# Altium footprint library connecteurs.PcbLib: 162 footprints (part 8 of 11)
Each footprint in its own frame and in the unit in brackets; x right, y up, seen from the top. Pads: shape width x height; smd on the part's side, far side on the other; paste and mask are expansions set on the pad; w line width, h text height; cw(c..) or ccw(c..) is an arc to the next point about the centre after c.
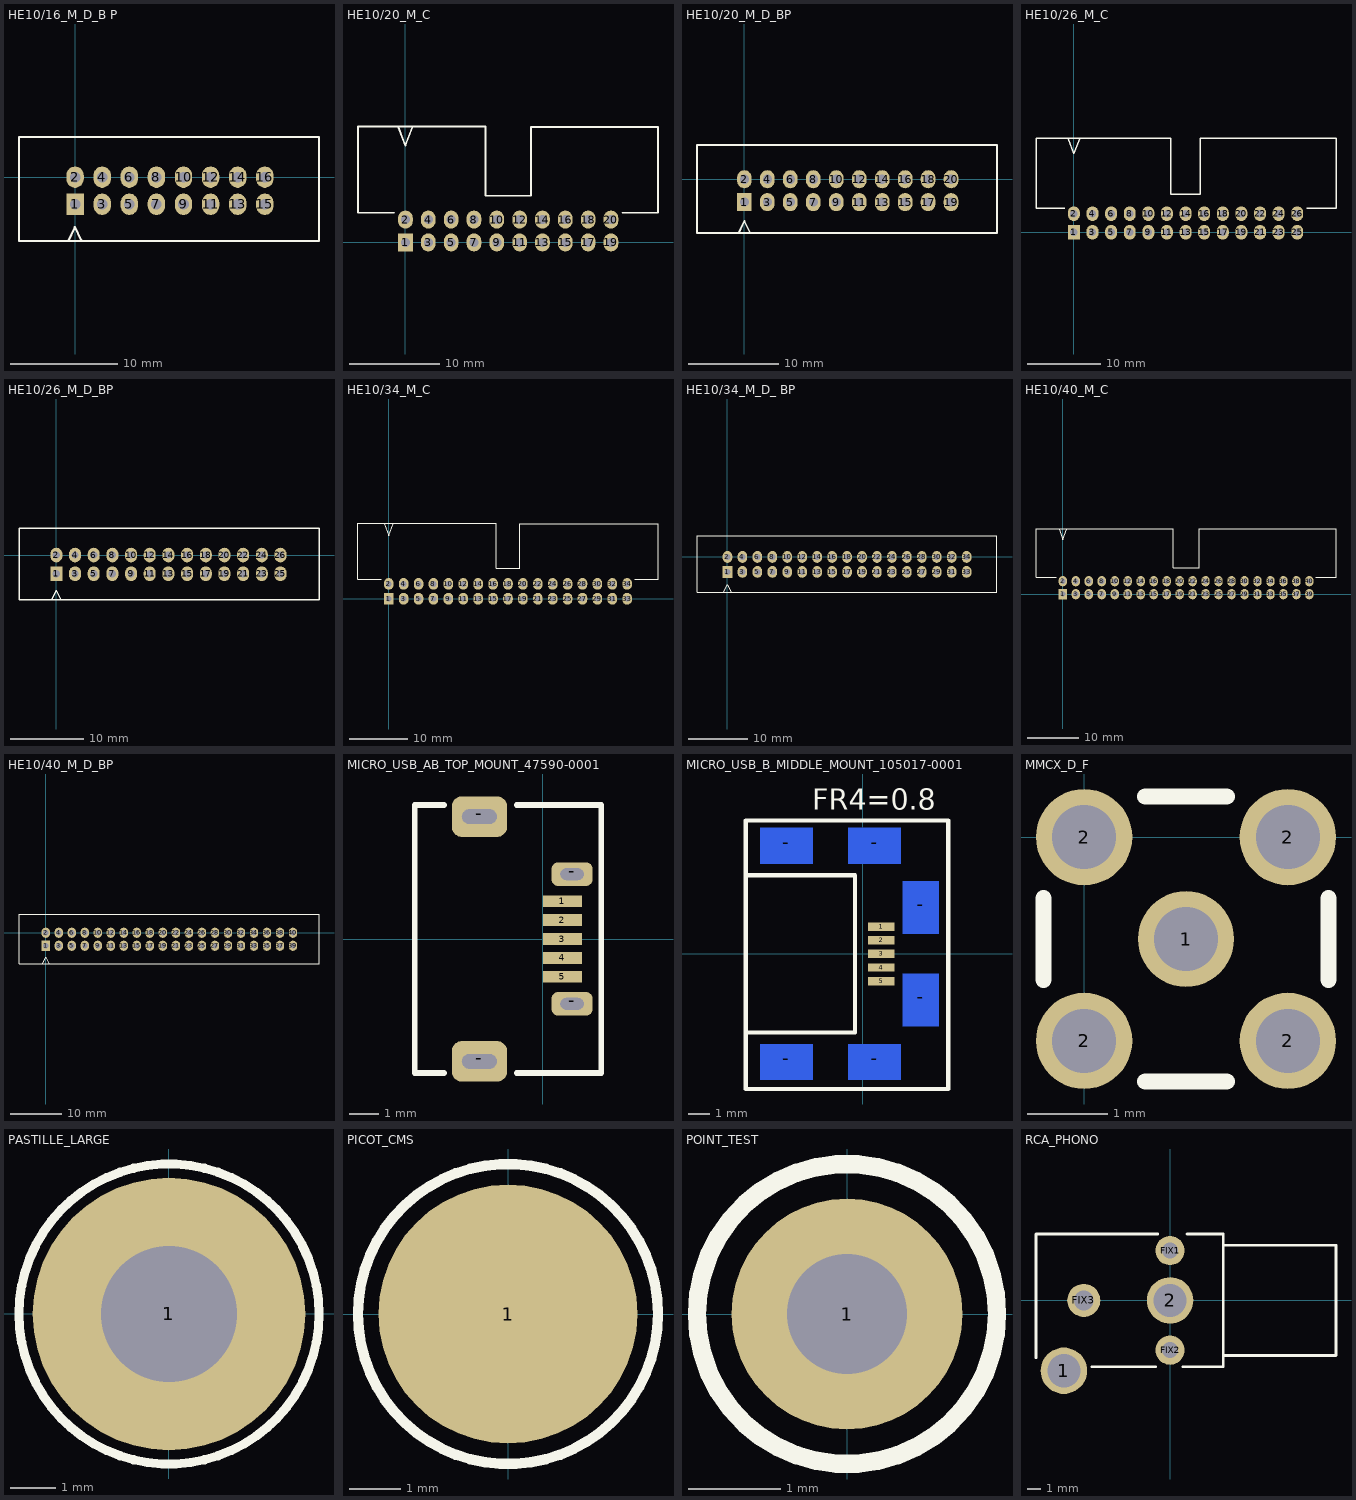
[diagram p7: the footprints below, top view; thin cyan lines are the x and y axes]

## HE10/16_M_D_B P [mm] "HE10 ; 16 CONTACTS ; MALE ;  DROIT; BAS PROFIL ; ESPACEMENTS BROCHES = 2.54 mm"
height 9
pads (16):
  rect 1.63x2 hole 1: 1(0,-2.54)
  oval 1.63x2 hole 1: 2(0,0) 3(2.54,-2.54) 4(2.54,0) 5(5.08,-2.54) 6(5.08,0) 7(7.62,-2.54) 8(7.62,0) 9(10.16,-2.54) 10(10.16,0) 11(12.7,-2.54) 12(12.7,0) 13(15.24,-2.54) 14(15.24,0) 15(17.78,-2.54) 16(17.78,0)
Top Overlay:
  lines w0.2: -0.627,-5.952 -0.03,-4.684 0.57,-5.9 ; -5.26,-6 -5.26,3.78 22.86,3.78 22.86,-6 -5.26,-6
3D body: height 8.8, standoff -3, extent -5.1,-5.8 22.72,3.6

## HE10/20_M_C [mm] "HE10 ; 20 CONTACTS ; MALE ;  COUDE; ESPACEMENTS BROCHES = 2.54 mm"
height 9
pads (20):
  rect 1.63x2 hole 1: 1(0,0)
  oval 1.63x2 hole 1: 2(0,2.54) 3(2.54,0) 4(2.54,2.54) 5(5.08,0) 6(5.08,2.54) 7(7.62,0) 8(7.62,2.54) 9(10.16,0) 10(10.16,2.54) 11(12.7,0) 12(12.7,2.54) 13(15.24,0) 14(15.24,2.54) 15(17.78,0) 16(17.78,2.54) 17(20.32,0) 18(20.32,2.54) 19(22.86,0) 20(22.86,2.54)
Top Overlay:
  lines w0.2: -1.27,3.29 -5.28,3.29 -5.28,12.88 8.89,12.88 8.89,5.18 13.97,5.18 13.97,12.84 28.09,12.84 28.09,3.29 24.13,3.29 ; -0.772,12.8 -0.01,10.768 0.752,12.8
3D body: height 9.56, standoff -3.14, extent -5.13,-0.354 27.89,12.6

## HE10/20_M_D_BP [mm] "HE10 ; 20 CONTACTS ; MALE ; DROIT; BAS PROFIL ; ESPACEMENTS BROCHES = 2.54 mm"
height 9
pads (20):
  rect 1.63x2 hole 1: 1(0,-2.54)
  oval 1.63x2 hole 1: 2(0,0) 3(2.54,-2.54) 4(2.54,0) 5(5.08,-2.54) 6(5.08,0) 7(7.62,-2.54) 8(7.62,0) 9(10.16,-2.54) 10(10.16,0) 11(12.7,-2.54) 12(12.7,0) 13(15.24,-2.54) 14(15.24,0) 15(17.78,-2.54) 16(17.78,0) 17(20.32,-2.54) 18(20.32,0) 19(22.86,-2.54) 20(22.86,0)
Top Overlay:
  lines w0.2: -0.6,-5.88 -0.004,-4.614 0,-4.614 0.6,-5.83 ; -5.24,-5.93 -5.24,3.77 27.94,3.77 27.94,-5.93 -5.24,-5.93
3D body: height 8.8, standoff -3, extent -5.1,-5.8 27.8,3.6

## HE10/26_M_C [mm] "HE10 ; 26 CONTACTS ; MALE ; COUDE ; ESPACEMENTS BROCHES = 2.54 mm"
height 9
pads (26):
  rect 1.63x2 hole 1: 1(0,0)
  oval 1.63x2 hole 1: 2(0,2.54) 3(2.54,0) 4(2.54,2.54) 5(5.08,0) 6(5.08,2.54) 7(7.62,0) 8(7.62,2.54) 9(10.16,0) 10(10.16,2.54) 11(12.7,0) 12(12.7,2.54) 13(15.24,0) 14(15.24,2.54) 15(17.78,0) 16(17.78,2.54) 17(20.32,0) 18(20.32,2.54) 19(22.86,0) 20(22.86,2.54) 21(25.4,0) 22(25.4,2.54) 23(27.94,0) 24(27.94,2.54) 25(30.48,0) 26(30.48,2.54)
Top Overlay:
  lines w0.2: -1.27,3.29 -5.17,3.29 -5.17,12.8 13.208,12.8 13.208,5.18 17.272,5.18 17.272,12.81 35.77,12.81 35.77,3.29 31.75,3.29 ; -0.752,12.77 0.01,10.738 0.772,12.77
3D body: height 9.46, standoff -3.24, extent -5.02,-0.3 35.62,12.654

## HE10/26_M_D_BP [mm] "HE10 ; 26 CONTACTS ; MALE ; DROIT; BAS PROFIL ; ESPACEMENTS BROCHES = 2.54 mm"
height 9
pads (26):
  rect 1.63x2 hole 1: 1(0,-2.54)
  oval 1.63x2 hole 1: 2(0,0) 3(2.54,-2.54) 4(2.54,0) 5(5.08,-2.54) 6(5.08,0) 7(7.62,-2.54) 8(7.62,0) 9(10.16,-2.54) 10(10.16,0) 11(12.7,-2.54) 12(12.7,0) 13(15.24,-2.54) 14(15.24,0) 15(17.78,-2.54) 16(17.78,0) 17(20.32,-2.54) 18(20.32,0) 19(22.86,-2.54) 20(22.86,0) 21(25.4,-2.54) 22(25.4,0) 23(27.94,-2.54) 24(27.94,0) 25(30.48,-2.54) 26(30.48,0)
Top Overlay:
  lines w0.2: -0.6,-6.05 -0.004,-4.784 0,-4.784 0.6,-6 ; -5.08,-6.07 -5.08,3.64 35.72,3.64 35.72,-6.07 -5.08,-6.07
3D body: height 8.8, standoff -3, extent -4.96,-5.9 35.56,3.5

## HE10/34_M_C [mm] "HE10 ; 34 CONTACTS ; MALE ; COUDE ; ESPACEMENTS BROCHES = 2.54 mm"
height 9
pads (34):
  rect 1.63x2 hole 1: 1(0,0)
  oval 1.63x2 hole 1: 2(0,2.54) 3(2.54,0) 4(2.54,2.54) 5(5.08,0) 6(5.08,2.54) 7(7.62,0) 8(7.62,2.54) 9(10.16,0) 10(10.16,2.54) 11(12.7,0) 12(12.7,2.54) 13(15.24,0) 14(15.24,2.54) 15(17.78,0) 16(17.78,2.54) 17(20.32,0) 18(20.32,2.54) 19(22.86,0) 20(22.86,2.54) 21(25.4,0) 22(25.4,2.54) 23(27.94,0) 24(27.94,2.54) 25(30.48,0) 26(30.48,2.54) 27(33.02,0) 28(33.02,2.54) 29(35.56,0) 30(35.56,2.54) 31(38.1,0) 32(38.1,2.54) 33(40.64,0) 34(40.64,2.54)
Top Overlay:
  lines w0.2: -1.27,3.29 -5.24,3.29 -5.24,12.85 18.288,12.85 18.288,5.18 22.352,5.18 22.352,12.82 45.89,12.82 45.89,3.29 41.91,3.29 ; -0.772,12.78 -0.01,10.748 0.752,12.78
3D body: height 9.46, standoff -3.24, extent -5.1,-0.3 45.7,12.654

## HE10/34_M_D_ BP [mm] "HE10 ; 34 CONTACTS ; MALE ; DROIT; BAS PROFIL ; ESPACEMENTS BROCHES = 2.54 mm"
height 9
pads (34):
  rect 1.63x2 hole 1: 1(0,-2.54)
  oval 1.63x2 hole 1: 2(0,0) 3(2.54,-2.54) 4(2.54,0) 5(5.08,-2.54) 6(5.08,0) 7(7.62,-2.54) 8(7.62,0) 9(10.16,-2.54) 10(10.16,0) 11(12.7,-2.54) 12(12.7,0) 13(15.24,-2.54) 14(15.24,0) 15(17.78,-2.54) 16(17.78,0) 17(20.32,-2.54) 18(20.32,0) 19(22.86,-2.54) 20(22.86,0) 21(25.4,-2.54) 22(25.4,0) 23(27.94,-2.54) 24(27.94,0) 25(30.48,-2.54) 26(30.48,0) 27(33.02,-2.54) 28(33.02,0) 29(35.56,-2.54) 30(35.56,0) 31(38.1,-2.54) 32(38.1,0) 33(40.64,-2.54) 34(40.64,0)
Top Overlay:
  lines w0.2: -0.6,-6.01 -0.004,-4.744 0,-4.744 0.6,-5.96 ; -5.18,-6.03 45.8,-6.03 45.8,3.63 -5.18,3.63 -5.18,-6.03
3D body: height 9, standoff -2.8, extent -5.04,-5.9 45.64,3.5

## HE10/40_M_C [mm] "HE10 ; 40 CONTACTS ; MALE ; COUDE ; ESPACEMENTS BROCHES = 2.54 mm"
height 9
pads (40):
  rect 1.63x2 hole 1: 1(0,0)
  oval 1.63x2 hole 1: 2(0,2.54) 3(2.54,0) 4(2.54,2.54) 5(5.08,0) 6(5.08,2.54) 7(7.62,0) 8(7.62,2.54) 9(10.16,0) 10(10.16,2.54) 11(12.7,0) 12(12.7,2.54) 13(15.24,0) 14(15.24,2.54) 15(17.78,0) 16(17.78,2.54) 17(20.32,0) 18(20.32,2.54) 19(22.86,0) 20(22.86,2.54) 21(25.4,0) 22(25.4,2.54) 23(27.94,0) 24(27.94,2.54) 25(30.48,0) 26(30.48,2.54) 27(33.02,0) 28(33.02,2.54) 29(35.56,0) 30(35.56,2.54) 31(38.1,0) 32(38.1,2.54) 33(40.64,0) 34(40.64,2.54) 35(43.18,0) 36(43.18,2.54) 37(45.72,0) 38(45.72,2.54) 39(48.26,0) 40(48.26,2.54)
Top Overlay:
  lines w0.2: -1.27,3.29 -5.25,3.29 -5.25,12.81 21.59,12.81 21.59,5.18 26.67,5.18 26.67,12.82 53.47,12.82 53.47,3.29 49.53,3.29 ; -0.742,12.72 0.02,10.688 0.782,12.72
3D body: height 9.46, standoff -3.24, extent -5.11,-0.3 53.31,12.654

## HE10/40_M_D_BP [mm] "HE10 ; 40 CONTACTS ; MALE ; DROIT; BAS PROFIL ; ESPACEMENTS BROCHES = 2.54 mm"
height 9
pads (40):
  rect 1.63x2 hole 1: 1(0,-2.54)
  oval 1.63x2 hole 1: 2(0,0) 3(2.54,-2.54) 4(2.54,0) 5(5.08,-2.54) 6(5.08,0) 7(7.62,-2.54) 8(7.62,0) 9(10.16,-2.54) 10(10.16,0) 11(12.7,-2.54) 12(12.7,0) 13(15.24,-2.54) 14(15.24,0) 15(17.78,-2.54) 16(17.78,0) 17(20.32,-2.54) 18(20.32,0) 19(22.86,-2.54) 20(22.86,0) 21(25.4,-2.54) 22(25.4,0) 23(27.94,-2.54) 24(27.94,0) 25(30.48,-2.54) 26(30.48,0) 27(33.02,-2.54) 28(33.02,0) 29(35.56,-2.54) 30(35.56,0) 31(38.1,-2.54) 32(38.1,0) 33(40.64,-2.54) 34(40.64,0) 35(43.18,-2.54) 36(43.18,0) 37(45.72,-2.54) 38(45.72,0) 39(48.26,-2.54) 40(48.26,0)
Top Overlay:
  lines w0.2: -0.59,-6.02 0.006,-4.754 0.01,-4.754 0.61,-5.97 ; -5.23,-6.05 53.34,-6.05 53.34,3.61 -5.23,3.61 -5.23,-6.05
3D body: height 8.8, standoff -3, extent -5.1,-5.9 53.2,3.5

## MICRO_USB_AB_TOP_MOUNT_47590-0001 [mm] "CONNECTEUR MICRO USB TYPE AB; MOLEX 47590-001; DIM=7.5mmx5,8mm"
height 3
pads (9):
  rect 1.35x0.4 smd: 1(0.67,1.3) 2(0.67,0.65) 3(0.67,0) 4(0.67,-0.65) 5(0.67,-1.3)
  rrect50% 1.9x1.4 hole 0.5 slot 1.2 at 0 deg: -(-2.18,-4.2) -(-2.18,4.2)
  rrect50% 1.4x0.8 hole 0.4 slot 0.8 at 0 deg: -(1,-2.225) -(1,2.225)
Top Overlay:
  lines w0.2: -3.4,-4.6 -4.4,-4.6 -4.4,4.6 -3.4,4.6 ; -0.9,-4.6 2,-4.6 2,4.6 -0.9,4.6

## MICRO_USB_B_MIDDLE_MOUNT_105017-0001 [mm] "CONNECTEUR MOLEX MICRO USB-B; MONTAGE MILIEU; 105017-0001; DIM=8,7mmx11mm"
height 2.94
pads (11):
  rect 1.25x0.4 smd: 1(0.87,1.3) 2(0.87,0.65) 3(0.87,0) 4(0.87,-0.65) 5(0.87,-1.3)
  rect 2.5x1.7 smd far side: -(-3.65,-5.15) -(-3.65,5.15) -(0.55,-5.15) -(0.55,5.15)
  rect 1.7x2.5 smd far side: -(2.75,-2.2) -(2.75,2.2)
Top Overlay:
  lines w0.2: -5.588,-3.75 -0.381,-3.75 -0.381,3.75 -5.588,3.75 ; -5.588,-6.44 4.064,-6.44 4.064,6.35 -5.588,6.35 -5.588,-6.44
  text "FR4=0.8" at -2.413,6.858 h1

## MMCX_D_F [mm] "CONNECTEUR MMCX ; COAX ; DROIT ; FEMELLE ; ESPACEMENT BROCHES GND = 2.54 mm"
height 4.5
pads (5):
  round 1.2 hole 0.8: 1(1.27,-1.27) 2(0,-2.54) 2(0,0) 2(2.54,-2.54) 2(2.54,0)
Top Overlay:
  lines w0.2: -0.508,-1.778 -0.508,-0.762 ; 0.762,-3.048 1.778,-3.048 ; 0.762,0.508 1.778,0.508 ; 3.048,-1.778 3.048,-0.762
3D body: height 4.43, standoff -2.94, extent -0.508,-3.02 2.992,0.48

## PASTILLE_LARGE [mm] "PASTILLE LARGE ; DIAMETRE = 6 mm ; TROU = 3 mm"
pads (1):
  round 6 hole 3: 1(0,0)
Top Overlay:
  circle w0.2: c0,0 r3.302

## PICOT_CMS [mm] "PASTILLE CMS ; DIAMETRE = 5 mm"
pads (1):
  round 5 smd: 1(0,0)
Top Overlay:
  circle w0.2: c0,0 r2.896

## POINT_TEST [mm] "PASTILLE TRAVERSANTE ; DIAMETRE = 2.5 mm ; DIAMETRE PERCAGE = 1.3 mm"
pads (1):
  round 2.5 hole 1.3: 1(0,0)
Top Overlay:
  circle w0.2: c0,0 r1.626
3D body: height 5.94, standoff -2.94, extent -1.24,-1.27 1.3,1.27

## RCA_PHONO [mm] "Connector; RCA; Female; Phono; PCB Mount;"
height 13
pads (5):
  round 3.5 hole 2.5: 1(-8,-5.3) 2(0,0)
  round 2.2 hole 1.2: FIX1(0,3.75) FIX2(0,-3.75)
  round 2.5 hole 1.5: FIX3(-6.5,0)
Top Overlay:
  lines w0.2: -10.1,-4.318 -10.1,5 -0.936,5 ; -5.906,-5 -1.08,-5 ; 0.952,-5 4,-5 4,0.064 ; 1.27,5 4,5 4,4.15 ; 4,4.15 12.5,4.15 12.5,-4.15 4,-4.15 4,4.15
3D body: height 13, standoff -3.99, extent -8.23,-5.354 11.277,4.654